# Altium footprint library PcbLib.PcbLib: 428 footprints (part 22 of 27)
Each footprint in its own frame and in the unit in brackets; x right, y up, seen from the top. Pads: shape width x height; smd on the part's side, far side on the other; paste and mask are expansions set on the pad; w line width, h text height; cw(c..) or ccw(c..) is an arc to the next point about the centre after c.
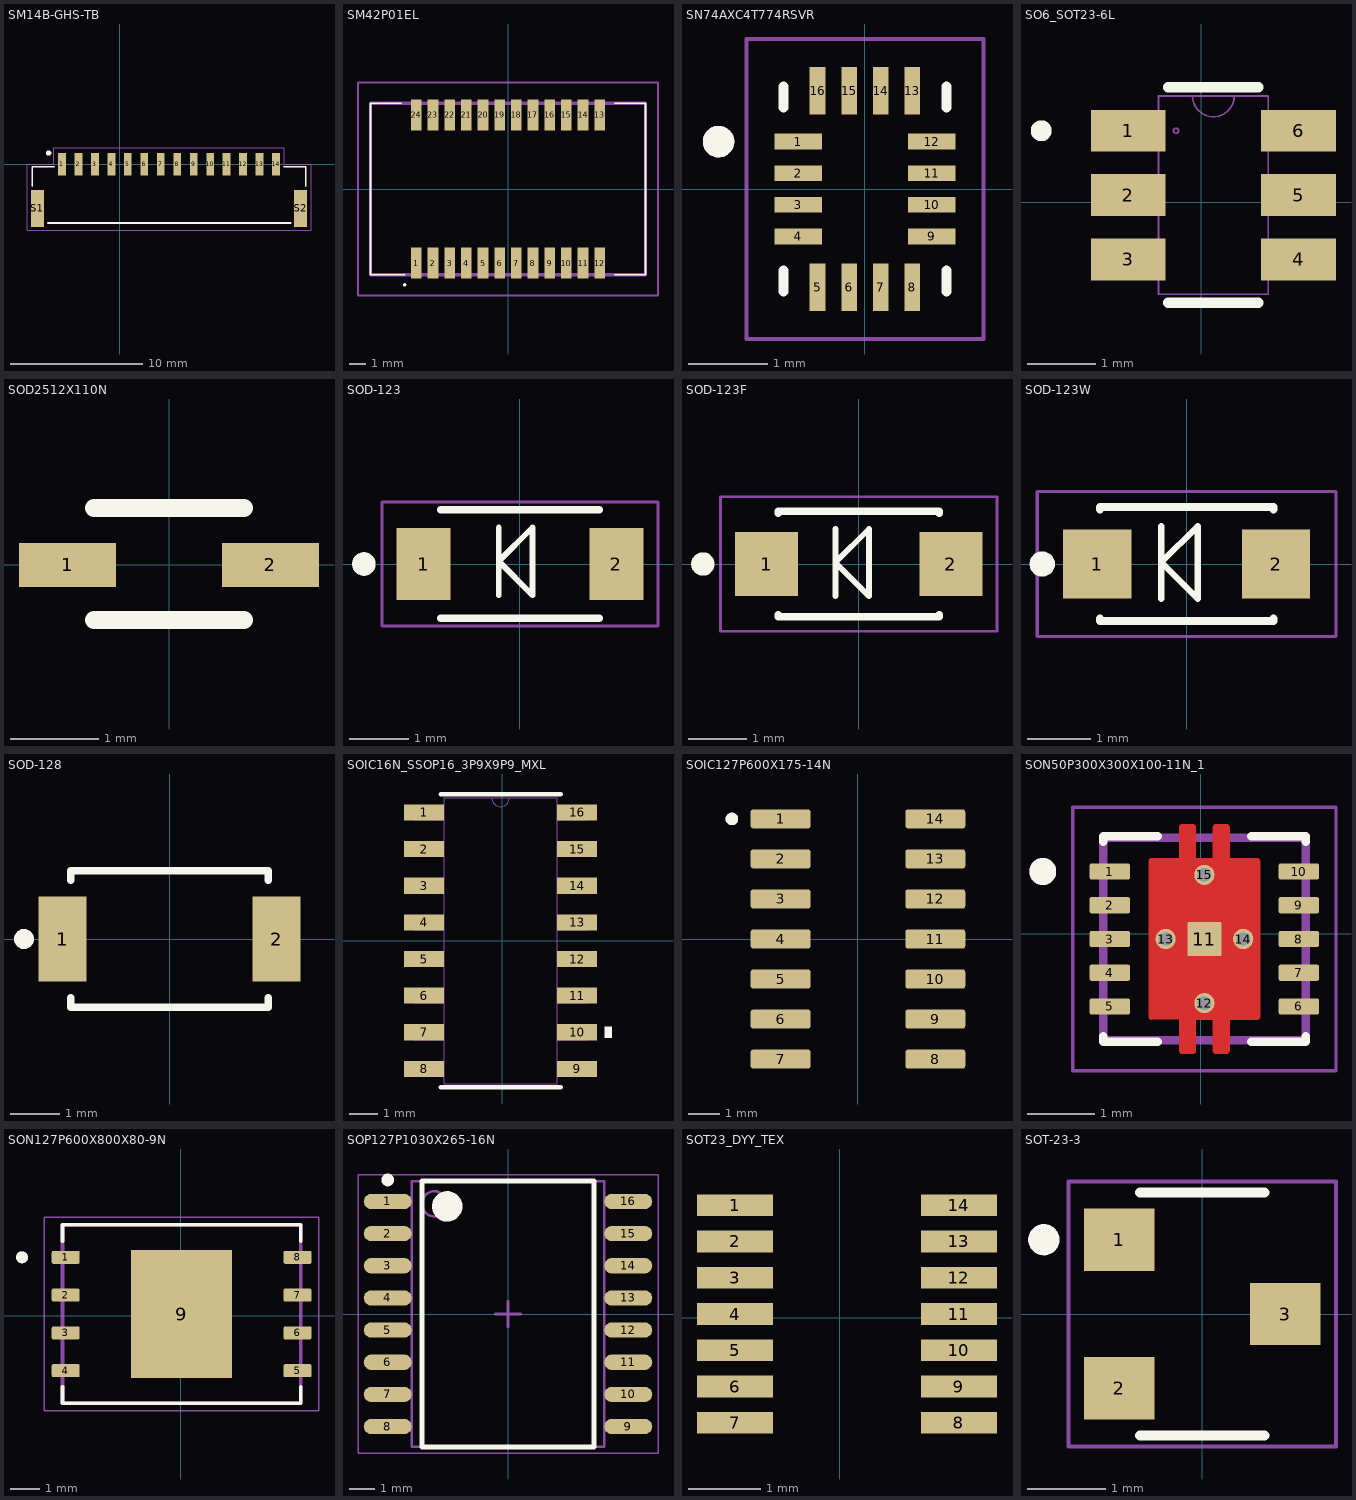
[diagram p21: the footprints below, top view; thin cyan lines are the x and y axes]

## SM14B-GHS-TB [mm]
pads (16):
  rect 0.6x1.7 smd: 1(-4.375,0) 2(-3.125,0) 3(-1.875,0) 4(-0.625,0) 5(0.625,0) 6(1.875,0) 7(3.125,0) 8(4.375,0) 9(5.625,0) 10(6.875,0) 11(8.125,0) 12(9.375,0) 13(10.625,0) 14(11.875,0)
  rect 1x2.8 smd: S1(-6.225,-3.35) S2(13.725,-3.35)
Top Overlay:
  circle w0.2: c-5.374,0.853 r0.1
  lines w0.127: -6.625,-1.65 -6.625,-0.2 -4.975,-0.2 ; -5.425,-4.45 12.979,-4.45 ; 12.468,-0.2 14.118,-0.2 14.118,-1.65
Mechanical 15:
  lines w0.05: -7,-5 14.529,-5 14.529,0 12.471,0 12.471,1.25 -5,1.25 -5,0 -7,0 -7,-5
3D body "SM14B-GHS-TB.STEP": height 4.45, standoff 0.1, extent -6.616,-4.393 14.134,0.457
3D body "GHR-14V-S.STEP": height 4.33, standoff 0.18, extent -5.618,-7.6 13.132,-1.9

## SM42P01EL [mm]
pads (24):
  rect 0.64x1.885 smd: 1(-5.5,-4.442) 2(-4.5,-4.442) 3(-3.5,-4.442) 4(-2.5,-4.442) 5(-1.5,-4.442) 6(-0.5,-4.442) 7(0.5,-4.442) 8(1.5,-4.442) 9(2.5,-4.442) 10(3.5,-4.442) 11(4.5,-4.442) 12(5.5,-4.442) 13(5.5,4.442) 14(4.5,4.442) 15(3.5,4.442) 16(2.5,4.442) 17(1.5,4.442) 18(0.5,4.442) 19(-0.5,4.442) 20(-1.5,4.442) 21(-2.5,4.442) 22(-3.5,4.442) 23(-4.5,4.442) 24(-5.5,4.442)
Top Overlay:
  lines w0.1: -6.4,5.15 -8.25,5.15 -8.25,-5.15 -6.2,-5.15 ; 6.4,-5.15 8.25,-5.15 8.25,5.15 6.4,5.15 ; -6.2,-5.8 ccw(c-6.2,-5.75) -6.2,-5.7 ccw(c-6.2,-5.75) -6.2,-5.8
Mechanical 13:
  lines w0.2: -8.25,-5.15 8.25,-5.15 8.25,5.15 -8.25,5.15 -8.25,-5.15
Mechanical 15:
  lines w0.1: -9,-6.385 9,-6.385 9,6.385 -9,6.385 -9,-6.385
3D body "SM42P01EL.stp": height 4.2, standoff 0, extent -8.25,-5.32 8.25,5.32

## SN74AXC4T774RSVR [mm]
pads (16):
  rect 0.6x0.2 smd: 1(-0.845,0.6) 2(-0.845,0.2) 3(-0.845,-0.2) 4(-0.845,-0.6) 9(0.845,-0.6) 10(0.845,-0.2) 11(0.845,0.2) 12(0.845,0.6)
  rect 0.2x0.6 smd: 5(-0.6,-1.245) 6(-0.2,-1.245) 7(0.2,-1.245) 8(0.6,-1.245) 13(0.6,1.245) 14(0.2,1.245) 15(-0.2,1.245) 16(-0.6,1.245)
Top Overlay:
  circle w0.2: c-1.855,0.6 r0.1
  lines w0.127: -1.03,-1.3 -1.03,-1.03 ; -1.03,1.03 -1.03,1.3 ; 1.03,-1.3 1.03,-1.03 ; 1.03,1.03 1.03,1.3
Mechanical 13:
  circle w0.2: c-1.855,0.6 r0.1
Mechanical 15:
  lines w0.05: -1.5,-1.9 -1.5,1.9 1.5,1.9 1.5,-1.9 -1.5,-1.9
3D body "step_temp.STEP": height 0.55, standoff 0, extent -0.9,-1.3 0.9,1.3

## SO6_SOT23-6L [mil]
pads (6):
  rect 43x24 smd paste+0 mask+0: 1(-42,41) 2(-42,4) 3(-42,-33) 4(56,-33) 5(56,4) 6(56,41)
Top Overlay:
  circle w6: c-92,41 r3
  lines w6: -18.88,-58 32.88,-58 ; -18.88,66 32.88,66
Mechanical 13:
  circle w1: c-14.5,41 r1.5
  lines w1: -5,61 ccw(c7,61) 19,61 ; -24.5,-53 38.5,-53 38.5,61 -24.5,61 -24.5,-53
3D body "SO6_SOT23-6L.step": height 57.09, standoff 0, extent -49.73,-53.01 63.73,61.01

## SOD2512X110N [mm]
pads (2):
  rect 1.1x0.5 smd: 1(-1.15,0) 2(1.15,0)
Top Overlay:
  lines w0.2: -0.85,-0.625 0.85,-0.625 ; -0.85,0.645 0.85,0.645
3D body "PESD3V3L1BAF.stp": height 0.95, standoff 0.02, extent -1.261,-0.62 1.227,0.63

## SOD-123 [mm]
pads (2):
  rect 0.915x1.22 smd: 1(-1.637,0) 2(1.637,0)
Top Overlay:
  circle w0.2: c-2.65,0 r0.1
  lines w0.1: -0.36,-0.53 -0.36,0.62 ; -0.36,0.045 0.215,0.62 0.215,-0.53 -0.36,0.045
  lines w0.127: -1.345,-0.924 1.345,-0.924 ; -1.345,0.924 1.345,0.924
Mechanical 15:
  lines w0.05: -2.345,-1.05 2.345,-1.05 2.345,1.05 -2.345,1.05 -2.345,-1.05
3D body "step_temp.STEP": height 1.35, standoff 0, extent -1.84,-0.8 1.84,0.8

## SOD-123F [mm]
pads (2):
  rect 1.08x1.09 smd: 1(-1.575,0) 2(1.575,0)
Top Overlay:
  circle w0.2: c-2.667,0 r0.1
  lines w0.1: -0.4,-0.55 -0.4,0.6 ; -0.4,0.025 0.175,0.6 0.175,-0.55 -0.4,0.025
  lines w0.127: -1.375,-0.865 -1.375,-0.9 1.375,-0.9 1.375,-0.865 ; -1.375,0.865 -1.375,0.9 1.375,0.9 1.375,0.865
Mechanical 15:
  lines w0.05: -2.365,-1.15 -2.365,1.15 2.365,1.15 2.365,-1.15 -2.365,-1.15
3D body "SOD3718X102N.step": height 1.15, standoff 0.05, extent -1.825,-0.875 1.825,0.875

## SOD-123W [mm]
pads (2):
  rect 1.08x1.09 smd: 1(-1.417,0) 2(1.417,0)
Top Overlay:
  circle w0.2: c-2.286,0 r0.1
  lines w0.1: -0.4,-0.55 -0.4,0.6 ; -0.4,0.025 0.175,0.6 0.175,-0.55 -0.4,0.025
  lines w0.127: -1.375,-0.865 -1.375,-0.9 1.375,-0.9 1.375,-0.865 ; -1.375,0.865 -1.375,0.9 1.375,0.9 1.375,0.865
Mechanical 15:
  lines w0.05: -2.365,-1.15 -2.365,1.15 2.365,1.15 2.365,-1.15 -2.365,-1.15
3D body "SOD3718X102N.step": height 1.15, standoff 0.05, extent -1.825,-0.875 1.825,0.875

## SOD-128 [mil]
pads (2):
  rect 38x67 smd paste+0 mask+0: 1(-84.5,0) 2(84.5,0)
Top Overlay:
  circle w7.87: c-115,0 r3.94
  lines w6: -78,-46.6 -78,-54 78,-54 78,-46.6 ; -78,46.6 -78,54 78,54 78,46.6
3D body "DIO_PDZVTFT_ROM.step": height 41.26, standoff 0, extent -95.51,-49.02 95.51,49.02

## SOIC16N_SSOP16_3P9X9P9_MXL [mm]
pads (16):
  rect 1.391x0.558 smd paste+0 mask+0: 1(-2.702,4.445) 2(-2.702,3.175) 3(-2.702,1.905) 4(-2.702,0.635) 5(-2.702,-0.635) 6(-2.702,-1.905) 7(-2.702,-3.175) 8(-2.702,-4.445) 9(2.601,-4.445) 10(2.601,-3.175) 11(2.601,-1.905) 12(2.601,-0.635) 13(2.601,0.635) 14(2.601,1.905) 15(2.601,3.175) 16(2.601,4.445)
Top Overlay:
  region: 3.55,-2.984 3.804,-2.984 3.804,-3.365 3.55,-3.365
  lines w0.152: -2.134,-5.08 2.032,-5.08 ; -2.134,5.08 2.032,5.08
Mechanical 13:
  lines w0.025: -0.356,4.953 ccw(c-0.051,4.953) 0.254,4.953 ; -3.048,-4.699 -2.007,-4.699 -2.007,-4.191 -3.048,-4.191 -3.048,-4.699 ; -3.048,-3.429 -2.007,-3.429 -2.007,-2.921 -3.048,-2.921 -3.048,-3.429 ; -3.048,-2.159 -2.007,-2.159 -2.007,-1.651 -3.048,-1.651 -3.048,-2.159 ; -3.048,-0.889 -2.007,-0.889 -2.007,-0.381 -3.048,-0.381 -3.048,-0.889 ; -3.048,0.381 -2.007,0.381 -2.007,0.889 -3.048,0.889 -3.048,0.381 ; -3.048,1.651 -2.007,1.651 -2.007,2.159 -3.048,2.159 -3.048,1.651 ; -3.048,2.921 -2.007,2.921 -2.007,3.429 -3.048,3.429 -3.048,2.921 ; -3.048,4.191 -2.007,4.191 -2.007,4.699 -3.048,4.699 -3.048,4.191 ; -2.007,-4.953 -2.007,4.953 1.905,4.953 1.905,-4.953 -2.007,-4.953 ; 1.905,-4.699 2.946,-4.699 2.946,-4.191 1.905,-4.191 1.905,-4.699 ; 1.905,-3.429 2.946,-3.429 2.946,-2.921 1.905,-2.921 1.905,-3.429 ; 1.905,-2.159 2.946,-2.159 2.946,-1.651 1.905,-1.651 1.905,-2.159 ; 1.905,-0.889 2.946,-0.889 2.946,-0.381 1.905,-0.381 1.905,-0.889 ; 1.905,0.381 2.946,0.381 2.946,0.889 1.905,0.889 1.905,0.381 ; 1.905,1.651 2.946,1.651 2.946,2.159 1.905,2.159 1.905,1.651 ; 1.905,2.921 2.946,2.921 2.946,3.429 1.905,3.429 1.905,2.921 ; 1.905,4.191 2.946,4.191 2.946,4.699 1.905,4.699 1.905,4.191
3D body "SOIC16N_SSOP16_3P9X9P9_MXL.step": height 1.76, standoff 0, extent -3.048,-4.953 2.946,4.953

## SOIC127P600X175-14N [mm]
pads (14):
  rrect25% 1.9x0.6 smd paste+0 mask+0.102: 1(-2.455,3.81) 2(-2.455,2.54) 3(-2.455,1.27) 4(-2.455,0) 5(-2.455,-1.27) 6(-2.455,-2.54) 7(-2.455,-3.81) 8(2.455,-3.81) 9(2.455,-2.54) 10(2.455,-1.27) 11(2.455,0) 12(2.455,1.27) 13(2.455,2.54) 14(2.455,3.81)
Top Overlay:
  circle w0.2: c-4,3.81 r0.1
Mechanical 13:
  circle w0.2: c-4,3.81 r0.1
3D body "SN74HCS00DR.STEP": height 1.75, standoff 0, extent -3,-4.325 3,4.325

## SON50P300X300X100-11N_1 [mm]
pads (15):
  rrect25% 0.6x0.24 smd paste+0 mask+0: 1(-1.349,0.924) 2(-1.349,0.424) 3(-1.349,-0.076) 4(-1.349,-0.576) 5(-1.349,-1.076) 6(1.451,-1.076) 7(1.451,-0.576) 8(1.451,-0.076) 9(1.451,0.424) 10(1.451,0.924)
  rrect5% 0.5x0.5 smd paste-1 mask+0: 11(0.051,-0.076)
  round 0.3 hole 0.2 mask+0: 12(0.051,-1.026) 13(-0.524,-0.076) 14(0.626,-0.076) 15(0.051,0.874)
Top Layer:
  region: 356 vertices and 0 holes, not listed, extent -0.774,-1.776 0.876,1.624
Top Overlay:
  circle w0.2: c-2.344,0.924 r0.1
  lines w0.127: -1.449,-1.516 -1.449,-1.596 -0.644,-1.596 ; -1.449,1.364 -1.449,1.444 -0.644,1.444 ; 0.746,-1.596 1.551,-1.596 1.551,-1.516 ; 0.746,1.444 1.551,1.444 1.551,1.364
Top Paste:
  drawing of 6 lines, arcs and shapes, not listed
Top Solder:
  drawing of 11 lines, arcs and shapes, not listed
Mechanical 13:
  circle w0.2: c-2.344,0.924 r0.1
  lines w0.127: -1.449,-1.576 -1.449,1.424 1.551,1.424 1.551,-1.576 -1.449,-1.576
Mechanical 15:
  lines w0.05: -1.899,-2.026 2.001,-2.026 2.001,1.874 -1.899,1.874 -1.899,-2.026

## SON127P600X800X80-9N [mm]
pads (9):
  rrect25% 0.94x0.44 smd paste+0 mask+0.102: 1(-3.87,1.956) 2(-3.87,0.686) 3(-3.87,-0.584) 4(-3.87,-1.854) 5(3.92,-1.854) 6(3.92,-0.584) 7(3.92,0.686) 8(3.92,1.956)
  rect 3.4x4.3 smd paste-3 mask+0.102: 9(0.025,0.051)
Top Overlay:
  circle w0.2: c-5.34,1.956 r0.1
  lines w0.127: -3.975,-2.394 -3.975,-2.949 4.025,-2.949 4.025,-2.394 ; -3.975,2.496 -3.975,3.051 4.025,3.051 4.025,2.496
Top Paste:
  region: 1.101,-1.309 -1.05,-1.309 -1.05,1.411 1.101,1.411
Mechanical 13:
  circle w0.2: c-5.34,1.956 r0.1
  lines w0.127: -3.975,-2.949 4.025,-2.949 4.025,3.051 -3.975,3.051 -3.975,-2.949
Mechanical 15:
  lines w0.05: -4.59,-3.199 -4.59,3.301 4.64,3.301 4.64,-3.199 -4.59,-3.199
3D body "step_temp.STEP": height 0.8, standoff 0, extent -3.975,-2.949 4.025,3.051

## SOP127P1030X265-16N [mm] "SOP, 16-Leads, Body 10.30x7.50mm, Pitch 1.27mm, IPC Medium Density"
height 2.65
pads (16):
  oval 1.9x0.6 smd: 1(-4.75,4.445) 2(-4.75,3.175) 3(-4.75,1.905) 4(-4.75,0.635) 5(-4.75,-0.635) 6(-4.75,-1.905) 7(-4.75,-3.175) 8(-4.75,-4.445) 9(4.75,-4.445) 10(4.75,-3.175) 11(4.75,-1.905) 12(4.75,-0.635) 13(4.75,0.635) 14(4.75,1.905) 15(4.75,3.175) 16(4.75,4.445)
Top Overlay:
  circle w0.6: c-2.4,4.25 r0.3
  circle w0.25: c-4.75,5.295 r0.125
  lines w0.2: -3.4,-5.25 3.4,-5.25 3.4,5.25 -3.4,5.25 -3.4,-5.25
Top Courtyard:
  lines w0.05: -5.925,-5.5 5.925,-5.5 5.925,5.5 -5.925,5.5 -5.925,-5.5
  lines w0.1: -0.5,0 0.5,0 ; 0,-0.5 0,0.5
Mechanical 13:
  circle w0.1: c-2.9,4.35 r0.5
  lines w0.1: -3.8,-5.25 3.8,-5.25 3.8,5.25 -3.8,5.25 -3.8,-5.25
3D body: height 4.25, standoff -0.85, extent -1.956,-0.864 15.062,12.116
3D body "SOP127P1030X265-16N.step": height 2.65, standoff 0, extent -5.15,-5.25 5.15,5.25

## SOT23_DYY_TEX [mm]
pads (14):
  rect 1.05x0.3 smd paste+0 mask+0: 1(-1.441,1.551) 2(-1.441,1.051) 3(-1.441,0.551) 4(-1.441,0.051) 5(-1.441,-0.449) 6(-1.441,-0.949) 7(-1.441,-1.45) 8(1.645,-1.45) 9(1.645,-0.949) 10(1.645,-0.449) 11(1.645,0.051) 12(1.645,0.551) 13(1.645,1.051) 14(1.645,1.551)
3D body "SOT23_DYY_TEX.step": height 1.09, standoff 0, extent -1.574,-2.095 1.778,2.197

## SOT-23-3 [mm]
pads (3):
  rect 0.9x0.8 smd: 1(-1.064,0.95) 2(-1.064,-0.95) 3(1.064,0)
Top Overlay:
  circle w0.2: c-2.032,0.953 r0.1
  lines w0.127: -0.8,-1.56 0.8,-1.56 ; -0.8,1.56 0.8,1.56
Mechanical 15:
  lines w0.05: -1.714,-1.7 -1.05,-1.7 1.05,-1.7 1.714,-1.7 1.714,1.7 1.05,1.7 -1.05,1.7 -1.714,1.7 -1.714,-1.7
3D body "PESD5V0U2BT,215.STEP": height 1.1, standoff 0, extent -1.15,-1.46 1.15,1.439